# Altium footprint library AD常用3D封装.PCBLIB: 342 footprints (part 14 of 22)
Each footprint in its own frame and in the unit in brackets; x right, y up, seen from the top. Pads: shape width x height; smd on the part's side, far side on the other; paste and mask are expansions set on the pad; w line width, h text height; cw(c..) or ccw(c..) is an arc to the next point about the centre after c.
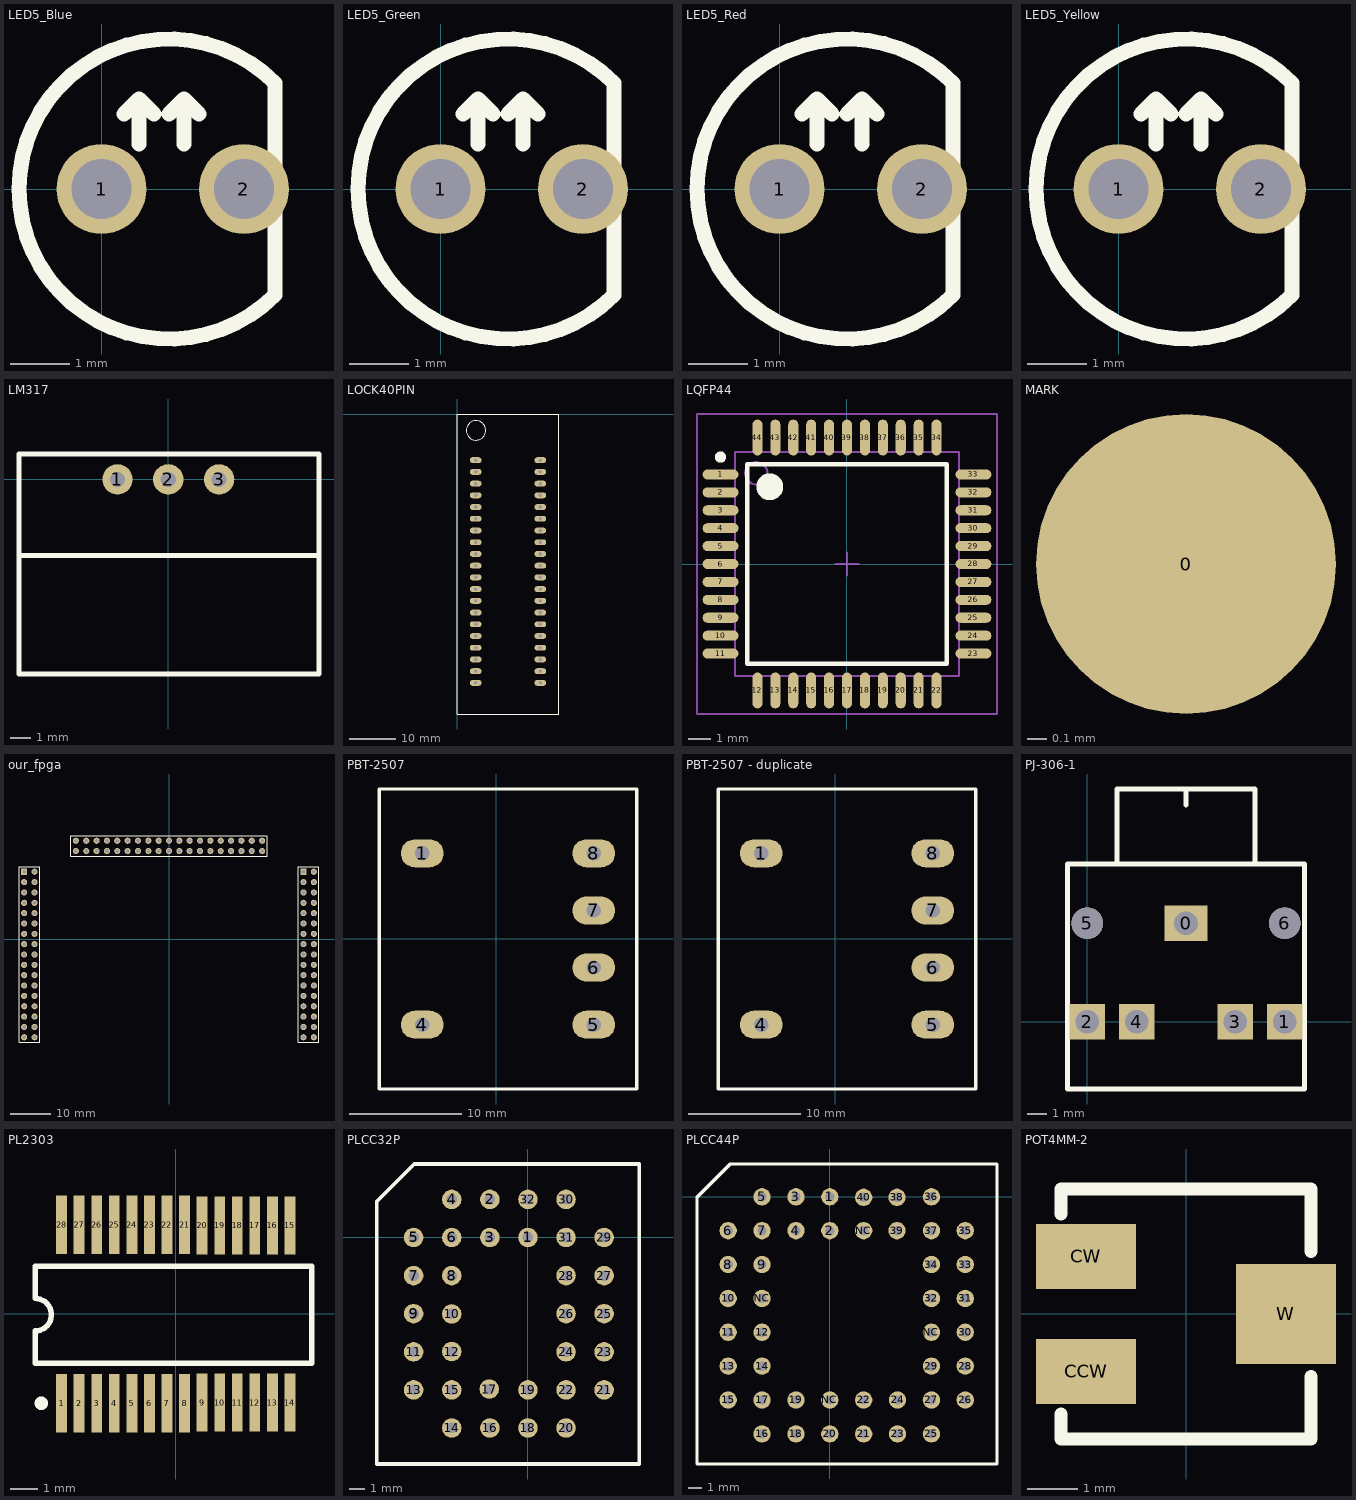
[diagram p13: the footprints below, top view; thin cyan lines are the x and y axes]

## LED5_Blue [mil]
pads (2):
  round 60 hole 40: 1(0,0) 2(95,0)
TopOverlay:
  lines w10: 15,50 25,60 ; 25,30 25,60 ; 35,50 25,60 ; 45,50 55,60 ; 55,30 55,60 ; 65,50 55,60 ; 115.71,-70.71 cw(c45,0) 115.71,70.71 115.71,-70.71
3D body: height 338.58, standoff -78.74, extent -65.31,-109.39 145.31,115

## LED5_Green [mil]
pads (2):
  round 60 hole 40: 1(0,0) 2(95,0)
TopOverlay:
  lines w10: 15,50 25,60 ; 25,30 25,60 ; 35,50 25,60 ; 45,50 55,60 ; 55,30 55,60 ; 65,50 55,60 ; 115.71,-70.71 cw(c45,0) 115.71,70.71 115.71,-70.71
3D body: height 338.58, standoff -78.74, extent -62.2,-112.19 148.43,112.2

## LED5_Red [mil]
pads (2):
  round 60 hole 40: 1(0,0) 2(95,0)
TopOverlay:
  lines w10: 15,50 25,60 ; 25,30 25,60 ; 35,50 25,60 ; 45,50 55,60 ; 55,30 55,60 ; 65,50 55,60 ; 115.71,-70.71 cw(c45,0) 115.71,70.71 115.71,-70.71
3D body: height 338.58, standoff -78.74, extent -65.32,-109.39 145.32,115

## LED5_Yellow [mil]
pads (2):
  round 60 hole 40: 1(0,0) 2(95,0)
TopOverlay:
  lines w10: 15,50 25,60 ; 25,30 25,60 ; 35,50 25,60 ; 45,50 55,60 ; 55,30 55,60 ; 65,50 55,60 ; 115.71,-70.71 cw(c45,0) 115.71,70.71 115.71,-70.71
3D body: height 338.58, standoff -78.74, extent -67.2,-112.19 143.43,112.2

## LM317 [mil]
pads (3):
  round 60 hole 30: 1(-100,0) 2(0,0) 3(100,0)
TopOverlay:
  lines w10: -287.5,-150 296.65,-150 ; -293.9,-383.07 -293.9,50 296.65,50 296.65,-383.07 188.39,-383.07 35.83,-383.07 -33.07,-383.07 -185.63,-383.07 -293.9,-383.07
3D body: height 787.4, standoff -166.14, extent -199.41,-137.99 199.41,75
3D body: height 984.25, standoff -149.61, extent -289.59,-383.07 292.35,42.18

## LOCK40PIN [mm] "green lock IC"
pads (40):
  oval 2.54x1.27 hole 0.8: 1(4,-10) 2(4,-12.54) 3(4,-15.08) 4(4,-17.62) 5(4,-20.16) 6(4,-22.7) 7(4,-25.24) 8(4,-27.78) 9(4,-30.32) 10(4,-32.86) 11(4,-35.4) 12(4,-37.94) 13(4,-40.48) 14(4,-43.02) 15(4,-45.56) 16(4,-48.1) 17(4,-50.64) 18(4,-53.18) 19(4,-55.72) 20(4,-58.26) 21(18,-58.26) 22(18,-55.72) 23(18,-53.18) 24(18,-50.64) 25(18,-48.1) 26(18,-45.56) 27(18,-43.02) 28(18,-40.48) 29(18,-37.94) 30(18,-35.4) 31(18,-32.86) 32(18,-30.32) 33(18,-27.78) 34(18,-25.24) 35(18,-22.7) 36(18,-20.16) 37(18,-17.62) 38(18,-15.08) 39(18,-12.54) 40(18,-10)
TopOverlay:
  circle w0.254: c4.064,-3.556 r2.095
  lines w0.254: 0,-65 0,0 22,0 22,-65 0,-65

## LQFP44 [mm] "QFN, 44-Leads, Body 10.0x10.0mm (max), Pitch 0.80mm, IPC Medium Density"
height 0.8
pads (44):
  oval 1.6x0.45 smd: 1(-5.65,4) 2(-5.65,3.2) 3(-5.65,2.4) 4(-5.65,1.6) 5(-5.65,0.8) 6(-5.65,0) 7(-5.65,-0.8) 8(-5.65,-1.6) 9(-5.65,-2.4) 10(-5.65,-3.2) 11(-5.65,-4) 23(5.65,-4) 24(5.65,-3.2) 25(5.65,-2.4) 26(5.65,-1.6) 27(5.65,-0.8) 28(5.65,0) 29(5.65,0.8) 30(5.65,1.6) 31(5.65,2.4) 32(5.65,3.2) 33(5.65,4)
  oval 0.45x1.6 smd: 12(-4,-5.65) 13(-3.2,-5.65) 14(-2.4,-5.65) 15(-1.6,-5.65) 16(-0.8,-5.65) 17(0,-5.65) 18(0.8,-5.65) 19(1.6,-5.65) 20(2.4,-5.65) 21(3.2,-5.65) 22(4,-5.65) 34(4,5.65) 35(3.2,5.65) 36(2.4,5.65) 37(1.6,5.65) 38(0.8,5.65) 39(0,5.65) 40(-0.8,5.65) 41(-1.6,5.65) 42(-2.4,5.65) 43(-3.2,5.65) 44(-4,5.65)
TopOverlay:
  circle w0.25: c-5.65,4.775 r0.125
  circle w0.6: c-3.45,3.45 r0.3
  lines w0.2: -4.45,-4.45 -4.45,4.45 4.45,4.45 4.45,-4.45 -4.45,-4.45
Mechanical13:
  circle w0.1: c-4.05,4.05 r0.5
  lines w0.1: -5,-5 -5,5 5,5 5,-5 -5,-5
Mechanical15:
  lines w0.1: -0.5,0 0.5,0 ; 0,-0.5 0,0.5 ; -6.7,-6.7 -6.7,6.7 6.7,6.7 6.7,-6.7 -6.7,-6.7
3D body: height 1.6, standoff 0.05, extent -5,-5 5,5

## MARK [mil]
pads (1):
  round 60 all layers, no hole: 0(49835,49945)

## our_fpga [mm]
pads (106):
  rect 1.5x1.5 hole 0.9: 1(-35.56,16.51) 73(33.02,16.51)
  round 1.5 hole 0.9: 2(-33.02,16.51) 3(-35.56,13.97) 4(-33.02,13.97) 5(-35.56,11.43) 6(-33.02,11.43) 7(-35.56,8.89) 8(-33.02,8.89) 9(-35.56,6.35) 10(-33.02,6.35) 11(-35.56,3.81) 12(-33.02,3.81) 13(-35.56,1.27) 14(-33.02,1.27) 15(-35.56,-1.27) 16(-33.02,-1.27) 17(-35.56,-3.81) 18(-33.02,-3.81) 19(-35.56,-6.35) 20(-33.02,-6.35) 21(-35.56,-8.89) 22(-33.02,-8.89) 23(-35.56,-11.43) 24(-33.02,-11.43) 25(-35.56,-13.97) 26(-33.02,-13.97) 27(-35.56,-16.51) 28(-33.02,-16.51) 29(-35.56,-19.05) 30(-33.02,-19.05) 31(-35.56,-21.59) 32(-33.02,-21.59) 33(-35.56,-24.13) 34(-33.02,-24.13) 35(-22.86,21.59) 36(-22.86,24.13) 37(-20.32,21.59) 38(-20.32,24.13) 39(-17.78,21.59) 40(-17.78,24.13) 41(-15.24,21.59) 42(-15.24,24.13) 43(-12.7,21.59) 44(-12.7,24.13) 45(-10.16,21.59) 46(-10.16,24.13) 47(-7.62,21.59) 48(-7.62,24.13) 49(-5.08,21.59) 50(-5.08,24.13) 51(-2.54,21.59) 52(-2.54,24.13) 53(0,21.59) 54(0,24.13) 55(2.54,21.59) 56(2.54,24.13) 57(5.08,21.59) 58(5.08,24.13) 59(7.62,21.59) 60(7.62,24.13) 61(10.16,21.59) 62(10.16,24.13) 63(12.7,21.59) 64(12.7,24.13) 65(15.24,21.59) 66(15.24,24.13) 67(17.78,21.59) 68(17.78,24.13) 69(20.32,21.59) 70(20.32,24.13) 71(22.86,21.59) 72(22.86,24.13) 74(35.56,16.51) 75(33.02,13.97) 76(35.56,13.97) 77(33.02,11.43) 78(35.56,11.43) 79(33.02,8.89) 80(35.56,8.89) 81(33.02,6.35) 82(35.56,6.35) 83(33.02,3.81) 84(35.56,3.81) 85(33.02,1.27) 86(35.56,1.27) 87(33.02,-1.27) 88(35.56,-1.27) 89(33.02,-3.81) 90(35.56,-3.81) 91(33.02,-6.35) 92(35.56,-6.35) 93(33.02,-8.89) 94(35.56,-8.89) 95(33.02,-11.43) 96(35.56,-11.43) 97(33.02,-13.97) 98(35.56,-13.97) 99(33.02,-16.51) 100(35.56,-16.51) 101(33.02,-19.05) 102(35.56,-19.05) 103(33.02,-21.59) 104(35.56,-21.59) 105(33.02,-24.13) 106(35.56,-24.13)
TopOverlay:
  lines w0.2: -36.83,-25.4 -31.75,-25.4 -31.75,17.78 -36.83,17.78 -36.83,-25.4 ; -24.13,20.32 24.13,20.32 24.13,25.4 -24.13,25.4 -24.13,20.32 ; 31.75,-25.4 31.75,17.78 36.83,17.78 36.83,-25.4 31.75,-25.4

## PBT-2507 [mil]
pads (6):
  oval 150x98 hole 50: 1(-259,299) 4(-259,-301) 5(341,-301) 6(341,-101) 7(341,99) 8(341,299)
TopOverlay:
  lines w12: -409,-526 -409,524 491,524 491,-526 -409,-526

## PBT-2507 - duplicate [mil]
pads (6):
  oval 150x98 hole 50: 1(-259,299) 4(-259,-301) 5(341,-301) 6(341,-101) 7(341,99) 8(341,299)
TopOverlay:
  lines w12: -409,-526 -409,524 491,524 491,-526 -409,-526

## PJ-306-1 [mm]
pads (7):
  rect 2.2x1.8 hole 1.2: 0(5,5)
  rect 1.8x1.8 hole 1.2: 1(10,0) 2(0,0) 3(7.5,0) 4(2.5,0)
  round 1.6 hole 1.6 unplated: 5(0,5) 6(10,5)
TopOverlay:
  lines w0.254: 1.5,8 1.5,11.8 8.4,11.8 ; 5,11 5,11.8 ; 8.5,8 8.5,11.8 ; -1,-3.4 -1,8 11,8 11,-3.4 -1,-3.4
3D body: height 3.2, standoff -10.8, extent -1.041,-3.689 11.059,11.411

## PL2303 [mm]
pads (28):
  rect 0.4x2.15 smd: 1(-4.224,-3.302) 2(-3.574,-3.302) 3(-2.924,-3.302) 4(-2.274,-3.302) 5(-1.624,-3.302) 6(-0.974,-3.302) 7(-0.324,-3.302) 8(0.326,-3.302) 9(0.974,-3.279) 10(1.624,-3.279) 11(2.274,-3.279) 12(2.924,-3.279) 13(3.574,-3.279) 14(4.224,-3.279) 15(4.224,3.275) 16(3.574,3.275) 17(2.924,3.275) 18(2.274,3.275) 19(1.624,3.275) 20(0.974,3.275) 21(0.326,3.302) 22(-0.324,3.302) 23(-0.974,3.302) 24(-1.624,3.302) 25(-2.274,3.302) 26(-2.924,3.302) 27(-3.574,3.302) 28(-4.224,3.302)
TopOverlay:
  circle w0.25: c-4.974,-3.302 r0.125
  lines w0.2: -5.199,-1.827 -5.199,-0.627 ccw(c-5.199,-0.027) -5.199,0.573 -5.199,1.773 5.036,1.773 5.036,-1.827 -5.199,-1.827

## PLCC32P [mm]
pads (32):
  round 1.3 hole 0.7: 1(0,0) 2(-2.54,2.54) 3(-2.54,0) 4(-5.08,2.54) 5(-7.62,0) 6(-5.08,0) 7(-7.62,-2.54) 8(-5.08,-2.54) 9(-7.62,-5.08) 10(-5.08,-5.1) 11(-7.62,-7.62) 12(-5.08,-7.6) 13(-7.62,-10.16) 14(-5.08,-12.7) 15(-5.08,-10.16) 16(-2.54,-12.7) 17(-2.58,-10.1) 18(0,-12.7) 19(0,-10.16) 20(2.54,-12.7) 21(5.08,-10.16) 22(2.54,-10.16) 23(5.08,-7.62) 24(2.54,-7.62) 25(5.08,-5.08) 26(2.54,-5.08) 27(5.08,-2.54) 28(2.54,-2.54) 29(5.08,0) 30(2.54,2.54) 31(2.54,0) 32(0,2.54)
TopOverlay:
  lines w0.254: -10.08,-15.1 7.42,-15.1 7.42,4.9 -5.08,4.9 -7.58,4.9 -10.08,2.4 -10.08,-0.1 -10.08,-15.1
3D body: height 2.89, standoff -0.4, extent -7.366,-12.558 5.134,2.348

## PLCC44P [mm]
pads (44):
  round 1.3 hole 0.7: 1(0,0) 2(0,-2.54) 3(-2.54,0) 4(-2.54,-2.54) 5(-5.08,0) 6(-7.62,-2.54) 7(-5.08,-2.54) 8(-7.62,-5.08) 9(-5.08,-5.08) 10(-7.62,-7.62) 11(-7.62,-10.16) 12(-5.08,-10.16) 13(-7.62,-12.7) 14(-5.08,-12.7) 15(-7.62,-15.24) 16(-5.08,-17.78) 17(-5.08,-15.24) 18(-2.54,-17.78) 19(-2.54,-15.24) 20(0,-17.78) 21(2.54,-17.78) 22(2.54,-15.24) 23(5.08,-17.78) 24(5.08,-15.24) 25(7.62,-17.78) 26(10.16,-15.24) 27(7.62,-15.24) 28(10.16,-12.7) 29(7.62,-12.7) 30(10.16,-10.16) 31(10.16,-7.62) 32(7.62,-7.62) 33(10.16,-5.08) 34(7.62,-5.08) 35(10.16,-2.54) 36(7.62,0) 37(7.62,-2.54) 38(5.04,-0.04) 39(5.04,-2.54) 40(2.54,-0.04) NC(-5.08,-7.62) NC(0,-15.24) NC(2.54,-2.54) NC(7.62,-10.16)
TopOverlay:
  lines w0.254: -9.96,-20.04 12.54,-20.04 12.54,2.46 -4.96,2.46 -7.46,2.46 -9.96,-0.04 -9.96,-2.54 -9.96,-20.04
3D body: height 4, standoff -0.6, extent -7.456,-17.438 9.844,-0.138

## POT4MM-2 [mm] "Square Trimming Potentiometer"
pads (3):
  rect 2x1.3 smd: CCW(-2,-1.15) CW(-2,1.15)
  rect 2x2 smd: W(2,0)
TopOverlay:
  lines w0.254: -2.5,-2 -2.5,-2.5 2.5,-2.5 2.5,-1.25 ; -2.5,2 -2.5,2.5 2.5,2.5 2.5,1.25
3D body: height 1.01, standoff -0.03, extent -2.204,-1.951 2.296,1.849